# Altium schematic symbol library Schlib.SchLib: 725 symbols (part 5 of 6) (continued)
## SQESC 2670
designator ESC?  (value not drawn)
LUCID_12S 90A ESC; Manufacturer Part Number: SQESC 2670
footprint SQESC 2670
pins: 1 GND, 2 BAT+, 3 U, 4 V, 5 W, 6 S_GND, 7 Tx, 8 PWM

## SQJA81EP-T1_GE3
designator Q?  (value not drawn)
Transistor MOSFET P-CH 80V 46A 8-Pin PowerPAK SO; Manufacturer: Vishay; Manufacturer Part Number: SQJA81EP-T1_GE3; Supplier: Mouser; Supplier Part Number: 78-SQJA81EP-T1_GE3; RoHS: No; Category: MOSFETs; Stock: 6541; Pricing: 1=2.15, 10=1.79, 50=1.79, 100=1.43, 1000=1.05, 10000=0.97 (USD)
footprint SQJA81EP-T1_GE3
pins: 1 S, 2 S, 3 S, 4 G, 5_0 D, 5_1 D, 5_2 D, 5_3 D

## SRV05-4.TCT
designator U?
SRV Series 17.5 V 3 pF SMT RailClamp® Low Capacitance TVS Diode Array SOT-23-6; Manufacturer: Semtech; Manufacturer Part Number: SRV05-4.TCT; Breakdown Voltage: 6V; Value: 5pF; Clamping Voltage: 12.5V; Current: 5A; Direction: Unidirectional; ESD Protection: Yes; Leakage Current: 5µA; Max Power Dissipation: 300W; Number of Bidirectional Channels: 4; Number of Elements: 1; Operating Supply Voltage: 5V; Peak Pulse Current: 12A; Test Current: 1mA; Supplier: Arrow Electronics; Supplier Part Number: SRV05-4.TCT; RoHS: Compliant; Category: TVS Diodes; Stock: 1566000; Pricing: 3000=0.3492 (USD); Case/Package: SOT-23; China RoHS: Compliant; Country of Origin: Mainland China; Depth: 1.6mm; Export Control Classification Number (ECCN) Code: EAR99; Height: 1.15mm; Harmonized Tariff Schedule (HTS) Code: 8541.10.00.50; Introduction Date: 2002-08-22; Lead Free: Lead Free; Length: 2.9mm; Lifecycle Status: Production; Max Breakdown Voltage: 6V; Max Operating Temperature: 125°C; Max Reverse Leakage Current: 5µA; Min Breakdown Voltage: 6V; Min Operating Temperature: -55°C; Mounting Technology: Surface Mount; Number of Channels: 4; Pins: 6; Number of Terminals: 6; Packaging: Cut Tape; Peak Pulse Power: 300W; Polarity: Unidirectional; Power Line Protection: Yes; Power Rating: 300W; Radiation Hardening: No; REACH SVHC: Yes; Reverse Breakdown Voltage: 6V; Reverse Standoff Voltage: 5V; Schedule B: 8542390000, 8542390000|8542390000|8542390000|8542390000|8542390000; Voltage: 5V; Voltage Rating (DC): 5V; Width: 1.6mm; Working Voltage: 5V; ComponentLink1URL: https://datasheet.octopart.com:443/SRV05-4.TCT-Semtech-datasheet-33008608.pdf?src-supplier=IHS; ComponentLink1Description: https://datasheet.octopart.com:443/SRV05-4.TCT-Semtech-datasheet-33008608.pdf?src-supplier=IHS; ComponentLink2URL: https://datasheet.octopart.com:443/SRV05-4.TCT-Semtech-datasheet-604703.pdf?src-supplier=Arrow+Electronics; ComponentLink2Description: https://datasheet.octopart.com:443/SRV05-4.TCT-Semtech-datasheet-604703.pdf?src-supplier=Arrow+Electronics; ComponentLink3URL: https://datasheet.octopart.com:443/SRV05-4.TCT-Semtech-datasheet-41194810.pdf?src-supplier=TME; ComponentLink3Description: https://datasheet.octopart.com:443/SRV05-4.TCT-Semtech-datasheet-41194810.pdf?src-supplier=TME; ComponentLink4URL: https://datasheet.octopart.com:443/SRV05-4.TCT-Semtech-datasheet-10542293.pdf?src-supplier=Farnell; ComponentLink4Description: https://datasheet.octopart.com:443/SRV05-4.TCT-Semtech-datasheet-10542293.pdf?src-supplier=Farnell; ComponentLink5URL: https://datasheet.octopart.com:443/SRV05-4.TCT-Semtech-datasheet-14048601.pdf?src-supplier=iiiC; ComponentLink5Description: https://datasheet.octopart.com:443/SRV05-4.TCT-Semtech-datasheet-14048601.pdf?src-supplier=iiiC
footprint SO6_SOT23-6L
pins: 1, 2, 3, 4, 5, 6

## SS-7188S-A-NF
designator J?  (value not drawn)
Modular Connectors / Ethernet Connectors RJ45 Connector; Manufacturer: Bel; Manufacturer Part Number: SS-7188S-A-NF; Supplier: Rs; Supplier Part Number: 437165; RoHS: Yes; Category: Connectors; Stock: 3103; Pricing: 1=2.19, 15=2.05, 50=1.96 (EUR); Lead Free: 5698LeadFree; ComponentLink1URL: https://datasheet.ciiva.com/11726/0900766b8001c3e8-11726092.pdf?src-supplier=Rs; ComponentLink1Description: https://datasheet.ciiva.com/11726/0900766b8001c3e8-11726092.pdf?src-supplier=Rs; ComponentLink2URL: https://datasheet.ciiva.com/685/ct710001-685643.pdf?src-supplier=Digikey; ComponentLink2Description: https://datasheet.ciiva.com/685/ct710001-685643.pdf?src-supplier=Digikey; ComponentLink3URL: https://datasheet.ciiva.com/26934/getdatasheetpartid-781435-26934401.pdf?src-supplier=Verical; ComponentLink3Description: https://datasheet.ciiva.com/26934/getdatasheetpartid-781435-26934401.pdf?src-supplier=Verical; ComponentLink4URL: https://datasheet.ciiva.com/3138/ct710001-3138744.pdf?src-supplier=Avnet; ComponentLink4Description: https://datasheet.ciiva.com/3138/ct710001-3138744.pdf?src-supplier=Avnet; ComponentLink5URL: https://datasheet.ciiva.com/15170/getdatasheetpartid-79418-15170477.pdf?src-supplier=Verical; ComponentLink5Description: https://datasheet.ciiva.com/15170/getdatasheetpartid-79418-15170477.pdf?src-supplier=Verical
footprint SS-7188S-A-NF
pins: 1 P1, 2 P2, 3 P3, 4 P4, 5 P5, 6 P6, 7 P7, 8 P8, S1 SHIELD, S2 SHIELD

## SSD_PINs
designator J?  (value not drawn)
67 Position Female Connector M.2 (NGFF) Mini Card Gold 0.020 (0.50mm) Black
footprint SSD layout
pins: 1, 2, 3 (power), 4, 5, 6, 7, 8, 9 (power), 10, 11, 12, 13, 14, 15 (power), 16, 17, 18, 19, 20, 21 (power), 22, 23, 24, 25, 26, 27 (power), 28, 29, 30, 31, 32, 33 (power), 34, 35, 36, 37, 38, 39 (power), 40, 41, 42, 43, 44, 45 (power), 46, 47, 48, 49, 50, 51 (power), 52, 53, 54, 55, 56, 57 (power), 58, 67, 68, 69, 70, 71, 72, 73, 74, 75

## STL6P3LLH6
designator Q?  (value not drawn)
P-channel 30 V, 0.024 Ohm typ., 6 A STripFET H6 Power MOSFET in a PowerFLAT 3.3 x 3.3 package; Manufacturer: STMicroelectronics; Manufacturer Part Number: STL6P3LLH6; Supplier: Mouser; Supplier Part Number: 511-STL6P3LLH6; RoHS: Yes; Category: MOSFETs; Stock: 55494; Pricing: 1=1.13, 10=0.925, 50=0.925, 100=0.719, 1000=0.497, 10000=0.434 (USD); ComponentLink1URL: http://www.mouser.com/ds/2/389/stl6p3llh6-956152.pdf?src-supplier=Mouser; ComponentLink1Description: http://www.mouser.com/ds/2/389/stl6p3llh6-956152.pdf?src-supplier=Mouser; ComponentLink2URL: http://www.farnell.com/datasheets/2819085.pdf?src-supplier=Farnell; ComponentLink2Description: http://www.farnell.com/datasheets/2819085.pdf?src-supplier=Farnell; ComponentLink3URL: http://www.st.com/st-web-ui/static/active/en/resource/technical/document/datasheet/DM00064617.pdf?src-supplier=Avnet; ComponentLink3Description: http://www.st.com/st-web-ui/static/active/en/resource/technical/document/datasheet/DM00064617.pdf?src-supplier=Avnet; ComponentLink4URL: https://datasheet.octopart.com/STL6P3LLH6-STMicroelectronics-datasheet-16349406.pdf?src-supplier=Future+Electronics; ComponentLink4Description: https://datasheet.octopart.com/STL6P3LLH6-STMicroelectronics-datasheet-16349406.pdf?src-supplier=Future+Electronics; ComponentLink5URL: http://www.st.com/content/ccc/resource/technical/document/datasheet/3c/90/16/29/a8/76/48/02/DM00064617.pdf/files/DM00064617.pdf/jcr:content/translations/en.DM00064617.pdf?src-supplier=Digikey; ComponentLink5Description: http://www.st.com/content/ccc/resource/technical/document/datasheet/3c/90/16/29/a8/76/48/02/DM00064617.pdf/files/DM00064617.pdf/jcr:content/translations/en.DM00064617.pdf?src-supplier=Digikey
footprint STL6P3LLH6
pins: 1 S, 2 S, 3 S, 4 G, 5 D5

## STM32F103C8T6
designator U?  (value not drawn)
ARM Cortex-M3 STM32 F1 Microcontroller 32-Bit 72MHz 64kB FLASH LQFP48 STM32F103C8T6; Manufacturer: STMicroelectronics; RAM Size: 20KB; Interface: I2C,SPI,USB,CAN,USART; Number of I/Os: 37; Number of Timers/Counters: 3; Max Supply Voltage: 3.6V; Number of ADC Channels: 10; Min Supply Voltage: 2V; Data Bus Width: 32b; Nominal Supply Current: 1.7uA; Number of A/D Converters: 2; Supplier: Mouser; Supplier Part Number: 511-STM32F103C8T6; Manufacturer Part Number: STM32F103C8T6; RoHS: Yes; Category: Microcontrollers; Stock: 24695; Pricing: 1=6.11, 10=5.53, 50=5.27, 100=4.58, 1000=3.47, 10000=3.33 (USD); Case/Package: LQFP; Pins: 48; Weight: 0.006349oz; Min Operating Temperature: -40°C; Max Operating Temperature: 85°C; Packaging: Tray; Package Quantity: 1500; Memory Format: FLASH; Clock Frequency: 72MHz; Memory Size: 64KB; Core Architecture: ARM; Series: STM32F103C8; Number of Channels: 10; Length: 7mm; Width: 7mm; Height: 1.4mm; Lead Free: Lead Free; RoHS Compliant: Yes
footprint STM32F103C8T6
pins: 1 VBAT, 2 PC13-TAMPER-RTC, 3 PC14-OSC32_IN, 4 PC15-OSC32_OUT, 5 PD0_OSC_IN, 6 PD1_OSC_OUT, 7 NRST, 8 VSSA, 9 VDDA, 10 PA0_WKUP, 11 PA1, 12 PA2, 13 PA3, 14 PA4, 15 PA5, 16 PA6, 17 PA7, 18 PB0, 19 PB1, 20 PB2/BOOT1, 21 PB10/I2C2_SCL, 22 PB11/I2C2_SDA, 23 VSS, 24 VDD, 25 PB12, 26 PB13, 27 PB14, 28 PB15, 29 PA8, 30 PA9, 31 PA10, 32 PA11, 33 PA12, 34 PA13/SWDIO, 35 VSS, 36 VDD, 37 PA14/SWCLK, 38 PA15, 39 PB3, 40 PB4, 41 PB5, 42 PB6/I2C1_SCL, 43 PB7/I2C1_SDA, 44 BOOT0, 45 PB8, 46 PB9, 47 VSS, 48 VDD

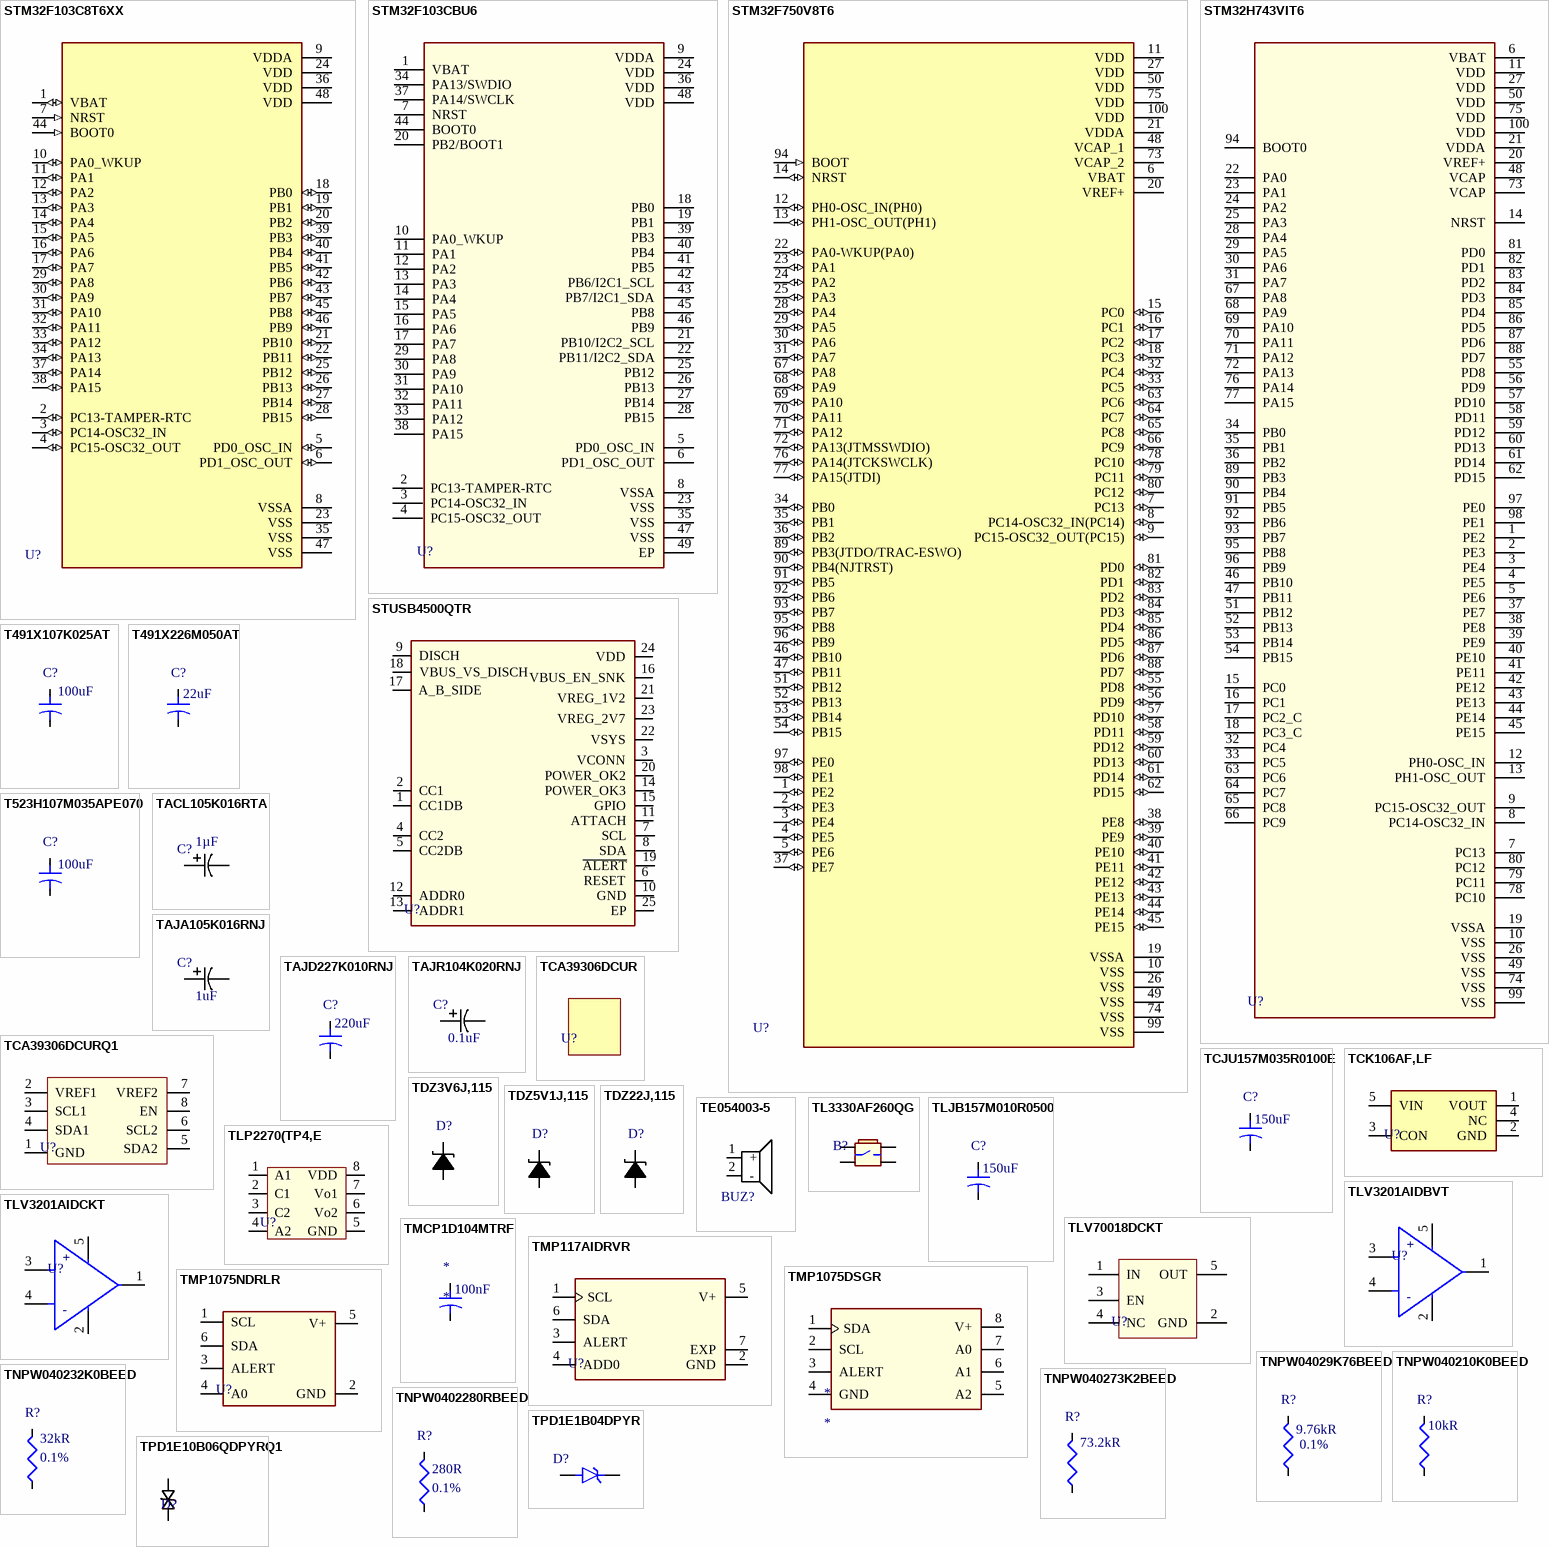
[diagram p19: symbols STM32F103C8T6XX to TPD1E10B06QDPYRQ1]

## STM32F103C8T6XX
designator U?
Ultra-low-power ARM Cortex-M3 MCU with 256 Kbytes Flash, 32 MHz CPU, USB, 2xOp-amp; Manufacturer Part Number: STM32F103C8T6; Manufacturer: STMicroelectronics; ADC Channels (Resolution): 14-Ch 12-Bit; DAC Channels (Resolution): 2-Ch 12-Bit (2); Data Bus Width: 32b; EEPROM Memory Size: 8kB; Flash Memory Size: 256kB; Frequency: 32MHz; Interface: IrDA, LIN, USB; Clock Frequency: 24MHz; Max Power Dissipation: 625mW; Max Supply Current: 12.3mA; Max Supply Voltage: 3.6V; Min Supply Voltage: 1.8V; Nominal Supply Current: 300nA; Number of Channels: 14; Number of D/A Converters: 2; Number of I/Os: 37; Number of SPI Channels: 3; Number of Timers/Counters: 1; Operating Supply Voltage: 3V; Oscillator Type: Internal; Peripherals: POR; RAM Size: 32kB; Watchdog Timer: Yes; Supplier: Arrow Electronics; Supplier Part Number: STM32L151CCU6TR; RoHS: Compliant; Category: Microcontrollers; Stock: 5000; Pricing: 2500=3.655 (USD); Case/Package: UFQFPN; China RoHS: Compliant; Core Architecture: ARM; Country of Origin: Mainland China; Export Control Classification Number (ECCN) Code: 3A991.A.2; Height - Seated (Max): 650µm; Harmonized Tariff Schedule (HTS) Code: 8542.31.00.25; Introduction Date: 2013-02-01; Length: 7mm; Lifecycle Status: Production; Max Operating Temperature: 85°C; Memory Size: 256kB; Memory Format: FLASH; Min Operating Temperature: -40°C; Number of I2C Channels: 2; Number of Programmable I/O: 37; Number of Terminals: 48; Number of USART Channels: 3; Packaging: Tape and Reel; REACH SVHC: Yes; Schedule B: 8542310000; Temperature Grade: Industrial; Terminal Pitch: 500µm; Width: 7mm; ComponentLink1URL: https://datasheet.octopart.com:443/STM32L151CCU6TR-STMicroelectronics-datasheet-104429913.pdf?src-supplier=IHS; ComponentLink1Description: https://datasheet.octopart.com:443/STM32L151CCU6TR-STMicroelectronics-datasheet-104429913.pdf?src-supplier=IHS; ComponentLink2URL: https://datasheet.octopart.com:443/STM32L151CCU6TR-STMicroelectronics-datasheet-13725669.pdf?src-supplier=Upverter; ComponentLink2Description: https://datasheet.octopart.com:443/STM32L151CCU6TR-STMicroelectronics-datasheet-13725669.pdf?src-supplier=Upverter; ComponentLink3URL: https://datasheet.octopart.com:443/STM32L151CCU6TR-STMicroelectronics-datasheet-62336827.pdf?src-supplier=Future+Electronics; ComponentLink3Description: https://datasheet.octopart.com:443/STM32L151CCU6TR-STMicroelectronics-datasheet-62336827.pdf?src-supplier=Future+Electronics; ComponentLink4URL: https://datasheet.octopart.com:443/STM32L151CCU6TR-STMicroelectronics-datasheet-159009206.pdf?src-supplier=SHENGYU+ELECTRONICS; ComponentLink4Description: https://datasheet.octopart.com:443/STM32L151CCU6TR-STMicroelectronics-datasheet-159009206.pdf?src-supplier=SHENGYU+ELECTRONICS
footprint LQFP-48
pins: 1 VBAT (io), 2 PC13-TAMPER-RTC (io), 3 PC14-OSC32_IN (io), 4 PC15-OSC32_OUT (io), 5 PD0_OSC_IN (io), 6 PD1_OSC_OUT (io), 7 NRST (in), 8 VSSA (power), 9 VDDA (power), 10 PA0_WKUP (io), 11 PA1 (io), 12 PA2 (io), 13 PA3 (io), 14 PA4 (io), 15 PA5 (io), 16 PA6 (io), 17 PA7 (io), 18 PB0 (io), 19 PB1 (io), 20 PB2 (io), 21 PB10 (io), 22 PB11 (io), 23 VSS (power), 24 VDD (power), 25 PB12 (io), 26 PB13 (io), 27 PB14 (io), 28 PB15 (io), 29 PA8 (io), 30 PA9 (io), 31 PA10 (io), 32 PA11 (io), 33 PA12 (io), 34 PA13 (io), 35 VSS (power), 36 VDD (power), 37 PA14 (io), 38 PA15 (io), 39 PB3 (io), 40 PB4 (io), 41 PB5 (io), 42 PB6 (io), 43 PB7 (io), 44 BOOT0 (in), 45 PB8 (io), 46 PB9 (io), 47 VSS (power), 48 VDD (power)

## STM32F103CBU6
designator U?  (value not drawn)
MCU 32-bit STM32F1 ARM Cortex M3 RISC 128KB Flash 2.5V/3.3V 48-Pin UFQFPN EP Tray; Manufacturer: STMicroelectronics; Manufacturer Part Number: STM32F103CBU6; Interface: I2C,SPI,USB,CAN,USART,IrDA,UART,LIN; Number of I/Os: 37; Oscillator Type: Internal; Peripherals: POR,PWM,WDT,DMA,Temp Sensor; Frequency: 72MHz; RAM Size: 20KB; Max Supply Voltage: 3.6V; Number of Timers/Counters: 4; Number of PWM Channels: 1; Min Supply Voltage: 2V; Data Bus Width: 32b; Number of ADC Channels: 10; Number of SPI Channels: 2; Watchdog Timer: Yes; Supplier: Mouser; Supplier Part Number: 511-STM32F103CBU6; RoHS: Yes; Category: Microcontrollers; Stock: 369; Pricing: 1=6.83, 10=6.17, 50=5.88, 100=5.11, 1000=3.87, 10000=3.87 (USD); Case/Package: UFQFPN; Pins: 48; Min Operating Temperature: -40°C; Max Operating Temperature: 85°C; Packaging: Tray; Memory Format: FLASH; Memory Size: 128KB; Core Architecture: ARM; Series: STM32 F1; Package Quantity: 260; Number of Programmable I/O: 37; Clock Frequency: 72MHz; Number of USB Channels: 1; Number of I2C Channels: 2; Length: 7.1mm; Width: 7.1mm; Height: 0.5mm; Radiation Hardening: No; RoHS Compliant: Yes; Reach SVHC Compliant: No; ComponentLink1URL: https://datasheet.ciiva.com/8054/1730126-8054952.pdf?src-supplier=Element14; ComponentLink1Description: https://datasheet.ciiva.com/8054/1730126-8054952.pdf?src-supplier=Element14; ComponentLink2URL: https://datasheet.ciiva.com/12271/cd00161566-12271965.pdf?src-supplier=Mouser; ComponentLink2Description: https://datasheet.ciiva.com/12271/cd00161566-12271965.pdf?src-supplier=Mouser
footprint STM32F103CBU6
pins: 1 VBAT, 2 PC13-TAMPER-RTC, 3 PC14-OSC32_IN, 4 PC15-OSC32_OUT, 5 PD0_OSC_IN, 6 PD1_OSC_OUT, 7 NRST, 8 VSSA, 9 VDDA, 10 PA0_WKUP, 11 PA1, 12 PA2, 13 PA3, 14 PA4, 15 PA5, 16 PA6, 17 PA7, 18 PB0, 19 PB1, 20 PB2/BOOT1, 21 PB10/I2C2_SCL, 22 PB11/I2C2_SDA, 23 VSS, 24 VDD, 25 PB12, 26 PB13, 27 PB14, 28 PB15, 29 PA8, 30 PA9, 31 PA10, 32 PA11, 33 PA12, 34 PA13/SWDIO, 35 VSS, 36 VDD, 37 PA14/SWCLK, 38 PA15, 39 PB3, 40 PB4, 41 PB5, 42 PB6/I2C1_SCL, 43 PB7/I2C1_SDA, 44 BOOT0, 45 PB8, 46 PB9, 47 VSS, 48 VDD, 49 EP

## STM32F750V8T6
designator U?
ARMÂ® CortexÂ®-M7 STM32F7 Microcontroller IC 32-Bit Single-Core 216MHz 64KB (64K x 8) FLASH 100-LQFP (14x14); Manufacturer Part Number: STM32F750V8T6
footprint QFP50P1600X1600X160-100N
pins: 1 PE2 (io), 2 PE3 (io), 3 PE4 (io), 4 PE5 (io), 5 PE6 (io), 6 VBAT (power), 7 PC13 (io), 8 PC14-OSC32_IN(PC14) (io), 9 PC15-OSC32_OUT(PC15) (io), 10 VSS (power), 11 VDD (power), 12 PH0-OSC_IN(PH0) (io), 13 PH1-OSC_OUT(PH1) (io), 14 NRST (io), 15 PC0 (io), 16 PC1 (io), 17 PC2 (io), 18 PC3 (io), 19 VSSA (power), 20 VREF+ (power), 21 VDDA (power), 22 PA0-WKUP(PA0) (io), 23 PA1 (io), 24 PA2 (io), 25 PA3 (io), 26 VSS (power), 27 VDD (power), 28 PA4 (io), 29 PA5 (io), 30 PA6 (io), 31 PA7 (io), 32 PC4 (io), 33 PC5 (io), 34 PB0 (io), 35 PB1 (io), 36 PB2 (io), 37 PE7 (io), 38 PE8 (io), 39 PE9 (io), 40 PE10 (io), 41 PE11 (io), 42 PE12 (io), 43 PE13 (io), 44 PE14 (io), 45 PE15 (io), 46 PB10 (io), 47 PB11 (io), 48 VCAP_1 (power), 49 VSS (power), 50 VDD (power), 51 PB12 (io), 52 PB13 (io), 53 PB14 (io), 54 PB15 (io), 55 PD8 (io), 56 PD9 (io), 57 PD10 (io), 58 PD11 (io), 59 PD12 (io), 60 PD13 (io), 61 PD14 (io), 62 PD15 (io), 63 PC6 (io), 64 PC7 (io), 65 PC8 (io), 66 PC9 (io), 67 PA8 (io), 68 PA9 (io), 69 PA10 (io), 70 PA11 (io), 71 PA12 (io), 72 PA13(JTMSSWDIO) (io), 73 VCAP_2 (power), 74 VSS (power), 75 VDD (power), 76 PA14(JTCKSWCLK) (io), 77 PA15(JTDI) (io), 78 PC10 (io), 79 PC11 (io), 80 PC12 (io), 81 PD0 (io), 82 PD1 (io), 83 PD2 (io), 84 PD3 (io), 85 PD4 (io), 86 PD5 (io), 87 PD6 (io), 88 PD7 (io), 89 PB3(JTDO/TRAC-ESWO) (io), 90 PB4(NJTRST) (io), 91 PB5 (io), 92 PB6 (io), 93 PB7 (io), 94 BOOT (in), 95 PB8 (io), 96 PB9 (io), 97 PE0 (io), 98 PE1 (io), 99 VSS (power), 100 VDD (power)

## STM32H743VIT6
designator U?  (value not drawn)
MCU 32-Bit STM32 ARM Cortex M7 RISC 2MB Flash 1.8V/2.5V/3.3V 100-Pin LQFP Tray; Manufacturer: STMicroelectronics; Manufacturer Part Number: STM32H743VIT6; Interface: I2C,SPI,USB,Ethernet,IrDA,MMC,SDIO,SD,UART,USART,EBI/EMI; Peripherals: Brown-out Detect/Reset,POR,PWM,WDT,DMA,LCD; Number of I/Os: 82; Oscillator Type: Internal; Supplier: Mouser; Supplier Part Number: 511-STM32H743VIT6; RoHS: Yes; Category: Microcontrollers; Stock: 20864; Pricing: 1=15.83, 10=14.55, 50=12.29, 100=12.29, 1000=10.02, 10000=10.02 (USD); Mounting Technology: Surface Mount; Case/Package: LQFP; Min Operating Temperature: -40°C; Max Operating Temperature: 85°C; Memory Format: FLASH; Packaging: Tray; Core Architecture: ARM; Memory Size: 2MB; Series: STM32H7; RoHS Compliant: Yes; ComponentLink1URL: http://www.farnell.com/datasheets/2551152.pdf?src-supplier=Farnell; ComponentLink1Description: http://www.farnell.com/datasheets/2551152.pdf?src-supplier=Farnell; ComponentLink2URL: http://www.farnell.com/datasheets/2551152.pdf?src-supplier=Element14; ComponentLink2Description: http://www.farnell.com/datasheets/2551152.pdf?src-supplier=Element14; ComponentLink3URL: http://www.farnell.com/datasheets/2551152.pdf?src-supplier=Newark; ComponentLink3Description: http://www.farnell.com/datasheets/2551152.pdf?src-supplier=Newark; ComponentLink4URL: http://www.st.com/content/ccc/resource/technical/document/reference_manual/group0/c9/a3/76/fa/55/46/45/fa/DM00314099/files/DM00314099.pdf/jcr:content/translations/en.DM00314099.pdf?src-supplier=Digikey; ComponentLink4Description: http://www.st.com/content/ccc/resource/technical/document/reference_manual/group0/c9/a3/76/fa/55/46/45/fa/DM00314099/files/DM00314099.pdf/jcr:content/translations/en.DM00314099.pdf?src-supplier=Digikey
footprint STM32H743VIT6
pins: 1 PE2, 2 PE3, 3 PE4, 4 PE5, 5 PE6, 6 VBAT, 7 PC13, 8 PC14-OSC32_IN, 9 PC15-OSC32_OUT, 10 VSS, 11 VDD, 12 PH0-OSC_IN, 13 PH1-OSC_OUT, 14 NRST, 15 PC0, 16 PC1, 17 PC2_C, 18 PC3_C, 19 VSSA, 20 VREF+, 21 VDDA, 22 PA0, 23 PA1, 24 PA2, 25 PA3, 26 VSS, 27 VDD, 28 PA4, 29 PA5, 30 PA6, 31 PA7, 32 PC4, 33 PC5, 34 PB0, 35 PB1, 36 PB2, 37 PE7, 38 PE8, 39 PE9, 40 PE10, 41 PE11, 42 PE12, 43 PE13, 44 PE14, 45 PE15, 46 PB10, 47 PB11, 48 VCAP, 49 VSS, 50 VDD, 51 PB12, 52 PB13, 53 PB14, 54 PB15, 55 PD8, 56 PD9, 57 PD10, 58 PD11, 59 PD12, 60 PD13, 61 PD14, 62 PD15, 63 PC6, 64 PC7, 65 PC8, 66 PC9, 67 PA8, 68 PA9, 69 PA10, 70 PA11, 71 PA12, 72 PA13, 73 VCAP, 74 VSS, 75 VDD, 76 PA14, 77 PA15, 78 PC10, 79 PC11, 80 PC12, 81 PD0, 82 PD1, 83 PD2, 84 PD3, 85 PD4, 86 PD5, 87 PD6, 88 PD7, 89 PB3, 90 PB4, 91 PB5, 92 PB6, 93 PB7, 94 BOOT0, 95 PB8, 96 PB9, 97 PE0, 98 PE1, 99 VSS, 100 VDD

## STUSB4500QTR
designator U?  (value not drawn)
4.1V~22V USB 2.0 I2C Controllers Interface ICs STUSB45 Controller 24-VFQFN Exposed Pad; Manufacturer: STMicroelectronics; Manufacturer Part Number: STUSB4500QTR; USB Standard: 6108USBStandard; Max Supply Voltage: 22V; Min Supply Voltage: 3V; Supplier: Mouser; Supplier Part Number: 511-STUSB4500QTR; RoHS: Yes; Category: USB Interface ICs; Stock: 30202; Pricing: 1=2.71, 10=2.44, 50=2.31, 100=2, 1000=1.44, 10000=1.36 (USD); Height: 1mm; ComponentLink1URL: http://www.farnell.com/datasheets/2710898.pdf?src-supplier=Farnell; ComponentLink1Description: http://www.farnell.com/datasheets/2710898.pdf?src-supplier=Farnell; ComponentLink2URL: http://www.farnell.com/datasheets/2710898.pdf?src-supplier=Element14; ComponentLink2Description: http://www.farnell.com/datasheets/2710898.pdf?src-supplier=Element14; ComponentLink3URL: http://www.farnell.com/datasheets/2710898.pdf?src-supplier=Newark; ComponentLink3Description: http://www.farnell.com/datasheets/2710898.pdf?src-supplier=Newark; ComponentLink4URL: http://www.st.com/content/ccc/resource/technical/document/datasheet/group3/1c/4a/55/d7/17/01/44/86/DM00489312/files/DM00489312.pdf/jcr:content/translations/en.DM00489312.pdf?src-supplier=Digikey; ComponentLink4Description: http://www.st.com/content/ccc/resource/technical/document/datasheet/group3/1c/4a/55/d7/17/01/44/86/DM00489312/files/DM00489312.pdf/jcr:content/translations/en.DM00489312.pdf?src-supplier=Digikey; ComponentLink5URL: https://datasheet.octopart.com/STUSB4500QTR-STMicroelectronics-datasheet-101746762.pdf?src-supplier=SHENGYU+ELECTRONICS; ComponentLink5Description: https://datasheet.octopart.com/STUSB4500QTR-STMicroelectronics-datasheet-101746762.pdf?src-supplier=SHENGYU+ELECTRONICS
pins: 1 CC1DB, 2 CC1, 3 VCONN, 4 CC2, 5 CC2DB, 6 RESET, 7 SCL, 8 SDA, 9 DISCH, 10 GND, 11 ATTACH, 12 ADDR0, 13 ADDR1, 14 POWER_OK3, 15 GPIO, 16 VBUS_EN_SNK, 17 A_B_SIDE, 18 VBUS_VS_DISCH, 19 ~{ALERT}, 20 POWER_OK2, 21 VREG_1V2, 22 VSYS, 23 VREG_2V7, 24 VDD, 25 EP

## T491X107K025AT
designator C?  value 100uF  (hidden comment: *)
Cap Tant Solid 100uF 25V X CASE 10% (7.3 X 4.3 X 4mm) Inward L SMD 7343-43 0.3 Ohm 125C T/R; Manufacturer: KEMET; Manufacturer Part Number: T491X107K025AT; Supplier: Mouser; Supplier Part Number: 80-T491X107K025AT; RoHS: No; Category: Tantalum Capacitors; Stock: 40606; Pricing: 1=2.57, 10=2.03, 50=2.03, 100=1.69, 1000=1.19, 10000=1.11 (USD); ComponentLink1URL: https://datasheet.ciiva.com/28571/1854511-28571717.pdf?src-supplier=Element14; ComponentLink1Description: https://datasheet.ciiva.com/28571/1854511-28571717.pdf?src-supplier=Element14; ComponentLink2URL: https://datasheet.ciiva.com/6229/kem-t2005-t491-6229625.pdf?src-supplier=Digikey; ComponentLink2Description: https://datasheet.ciiva.com/6229/kem-t2005-t491-6229625.pdf?src-supplier=Digikey; ComponentLink3URL: https://datasheet.ciiva.com/6229/kem-t2005-t491-6229626.pdf?src-supplier=Digikey; ComponentLink3Description: https://datasheet.ciiva.com/6229/kem-t2005-t491-6229626.pdf?src-supplier=Digikey; ComponentLink4URL: https://datasheet.ciiva.com/6229/kem-t2005-t491-6229627.pdf?src-supplier=Digikey; ComponentLink4Description: https://datasheet.ciiva.com/6229/kem-t2005-t491-6229627.pdf?src-supplier=Digikey; ComponentLink5URL: https://datasheet.ciiva.com/22716/1854511-22716393.pdf?src-supplier=Element14; ComponentLink5Description: https://datasheet.ciiva.com/22716/1854511-22716393.pdf?src-supplier=Element14; ComponentLink6URL: https://datasheet.ciiva.com/22716/1854511-22716394.pdf?src-supplier=Element14; ComponentLink6Description: https://datasheet.ciiva.com/22716/1854511-22716394.pdf?src-supplier=Element14; Case/Package: 2917
footprint Tantal 2917  Height 4.30mm
pins: 1 P, 2 N

## T491X226M050AT
designator C?  value 22uF  (hidden comment: *)
Cap Tant Solid 22uF 50V X CASE 20% (7.3 X 4.3 X 4mm) SMD 7343-43 0.6 Ohm 125 C T/R; Manufacturer: KEMET; Manufacturer Part Number: T491X226M050AT; Supplier: Farnell; Supplier Part Number: 2535289; RoHS: Yes; Category: Tantalum Capacitors; Stock: 500; Pricing: 1=5.36, 10=4.05, 50=3.46, 100=3.28 (EUR); ComponentLink1URL: https://datasheet.ciiva.com/22691/1778339-22691440.pdf?src-supplier=Element14; ComponentLink1Description: https://datasheet.ciiva.com/22691/1778339-22691440.pdf?src-supplier=Element14; ComponentLink2URL: https://datasheet.ciiva.com/6247/datasheetpn-t491x226m050at-6247266.pdf?src-supplier=Digikey; ComponentLink2Description: https://datasheet.ciiva.com/6247/datasheetpn-t491x226m050at-6247266.pdf?src-supplier=Digikey; ComponentLink3URL: https://datasheet.ciiva.com/12882/kem-t2005-t491-12882698.pdf?src-supplier=Mouser; ComponentLink3Description: https://datasheet.ciiva.com/12882/kem-t2005-t491-12882698.pdf?src-supplier=Mouser; ComponentLink4URL: https://datasheet.ciiva.com/6247/kem-t2005-t491-6247262.pdf?src-supplier=Digikey; ComponentLink4Description: https://datasheet.ciiva.com/6247/kem-t2005-t491-6247262.pdf?src-supplier=Digikey
footprint Tantal 2917  Height 4.30mm
pins: 1 P, 2 N

## T523H107M035APE070
designator C?  value 100uF  (hidden comment: *)
Cap Tant Polymer 100uF 35VDC H CASE 20% (7.3 X 6 X 1.9mm) SMD 7360-20 0.07 Ohm 85°C T/R; Manufacturer: KEMET; Manufacturer Part Number: T523H107M035APE070; Supplier: Mouser; Supplier Part Number: 80-T523H107M35APE070; RoHS: Yes; Category: Polymer Capacitors; Stock: 2913; Pricing: 1=4.62, 10=3.98, 50=3.61, 100=2.98, 1000=2.4, 10000=2.35 (USD); ComponentLink1URL: https://media.digikey.com/pdf/Data%20Sheets/Kemet%20PDFs/T523H107M035APE070_Spec_Prelim.pdf?src-supplier=Digikey; ComponentLink1Description: https://media.digikey.com/pdf/Data%20Sheets/Kemet%20PDFs/T523H107M035APE070_Spec_Prelim.pdf?src-supplier=Digikey; ComponentLink2URL: https://datasheet.octopart.com/T523H107M035APE070-KEMET-datasheet-158238326.pdf?src-supplier=TME; ComponentLink2Description: https://datasheet.octopart.com/T523H107M035APE070-KEMET-datasheet-158238326.pdf?src-supplier=TME
footprint T523H107M035APE070 (Molded Capacitor, 2-Leads, Body 7.30x6.10mm, IPC Medium Density)
pins: 1 P, 2 N

## TACL105K016RTA
designator C?  value 1µF  (hidden comment: *)
Cap Tant Solid 1uF 16V L CASE 10% (1.6 X 0.85 X 0.85mm) SMD 1608-10 7.5 Ohm 125C Plastic T/R; Manufacturer: KYOCERA AVX; Manufacturer Part Number: TACL105K016RTA; Dielectric Material: Tantalum; Dissipation Factor: 6%; ESR (Equivalent Series Resistance): 7.5Ω; Leakage Current: 500nA; Polarity: Polar; Ripple Current: 23mA; Supplier: DigiKey; Supplier Part Number: 478-12994-1-ND; RoHS: Compliant; Category: Tantalum Capacitors; Stock: 527; Pricing: 1=2.43, 10=1.667, 50=1.3632, 100=1.2692, 500=1.1102, 1000=1.0684 (USD); Case/Package: 0603; Case Code (Imperial): 0603; Case Code (Metric): 1608; China RoHS: Compliant; Depth: 850µm; Height: 850µm; Length: 1.6mm; Lifecycle Status: Production; Max Operating Temperature: 125°C; Min Operating Temperature: -55°C; Mounting Technology: Surface Mount; Pins: 2; Number of Terminals: 2; Radiation Hardening: No; REACH SVHC: Yes; Schedule B: 8532210050; Termination: SMD/SMT; Tolerance: 10%; Voltage Rating: 16V; Voltage Rating (DC): 16V; Weight: 2.012816mg; Width: 850µm; ComponentLink1URL: https://datasheet.octopart.com:443/TACL105K016RTA-KYOCERA-AVX-datasheet-158983642.pdf?src-supplier=Newark; ComponentLink1Description: https://datasheet.octopart.com:443/TACL105K016RTA-KYOCERA-AVX-datasheet-158983642.pdf?src-supplier=Newark; ComponentLink2URL: https://datasheet.octopart.com:443/TACL105K016RTA-KYOCERA-AVX-datasheet-21192561.pdf?src-supplier=Newark; ComponentLink2Description: https://datasheet.octopart.com:443/TACL105K016RTA-KYOCERA-AVX-datasheet-21192561.pdf?src-supplier=Newark; ComponentLink3URL: https://datasheet.octopart.com:443/TACL105K016RTA-KYOCERA-AVX-datasheet-182064648.pdf?src-supplier=IHS; ComponentLink3Description: https://datasheet.octopart.com:443/TACL105K016RTA-KYOCERA-AVX-datasheet-182064648.pdf?src-supplier=IHS; ComponentLink4URL: https://datasheet.octopart.com:443/TACL105K016RTA-KYOCERA-AVX-datasheet-50868554.pdf?src-supplier=Future+Electronics; ComponentLink4Description: https://datasheet.octopart.com:443/TACL105K016RTA-KYOCERA-AVX-datasheet-50868554.pdf?src-supplier=Future+Electronics; ComponentLink5URL: http://sigma.octopart.com:80/reach_statement/AVX-company-19.pdf?src-supplier=Compliance+Statements; ComponentLink5Description: http://sigma.octopart.com:80/reach_statement/AVX-company-19.pdf?src-supplier=Compliance+Statements; ComponentLink6URL: http://sigma.octopart.com:80/conflict_mineral_statement/AVX-company-34.pdf?src-supplier=Compliance+Statements; ComponentLink6Description: http://sigma.octopart.com:80/conflict_mineral_statement/AVX-company-34.pdf?src-supplier=Compliance+Statements
footprint C Tan 0603
pins: 1, 2

## TAJA105K016RNJ
designator C?  value 1uF
Cap Tant Solid 1uF 16V A CASE 10%( 3.2 X 1.6 X 1.6mm) Inward L SMD 3216-18 11 Ohm 125C T/R; Part Number: TAJA105K016RNJ; Manufacturer: Kyocera AVX; Dielectric Material: Tantalum; Tolerance: 20%; ESR (Equivalent Series Resistance): 11R; Leakage Current: 500nA; Dissipation Factor: 4%; Life (Hours): 2000Hour; Ripple Current: 83mA; Supplier: Future Electronics; Supplier Part Number: 4679627; Manufacturer Part Number: TAJA105K016RNJ; RoHS: Yes; Category: Tantalum Capacitors; Stock: 130000; Pricing: 2000=0.0674, 4000=0.0662, 6000=0.0655, 8000=0.065, 10000=0.0634 (USD); Mounting Technology: Surface Mount,PCB; Case/Package: 1206; Pins: 2; Case Code (Metric): 3216; Case Code (Imperial): 1206; Weight: 0.000571oz; Min Operating Temperature: -55°C; Max Operating Temperature: 125°C; Voltage Rating (DC): 16V; Series: TAJ; Voltage Rating: 16V; Packaging: Tape and Reel; Features: General Purpose; Termination: SMD/SMT; Voltage: 16V; Voltage Rating (AC): 16V; Length: 3.2mm; Width: 1.6mm; Height: 1.6mm; Depth: 1.6mm; Lead Pitch: 1.1mm; Reach SVHC Compliant: No; Lead Free: Lead Free; RoHS Compliant: Yes; ComponentLink1URL: https://datasheet.ciiva.com/263/taj-263409.pdf?src-supplier=Digikey; ComponentLink1Description: https://datasheet.ciiva.com/263/taj-263409.pdf?src-supplier=Digikey; ComponentLink2URL: https://datasheet.ciiva.com/263/taj-263410.pdf?src-supplier=Digikey; ComponentLink2Description: https://datasheet.ciiva.com/263/taj-263410.pdf?src-supplier=Digikey; ComponentLink3URL: https://datasheet.ciiva.com/263/taj-263411.pdf?src-supplier=Digikey; ComponentLink3Description: https://datasheet.ciiva.com/263/taj-263411.pdf?src-supplier=Digikey; ComponentLink4URL: https://datasheet.ciiva.com/18710/taj-eng-18710647.pdf?src-supplier=Distrelec; ComponentLink4Description: https://datasheet.ciiva.com/18710/taj-eng-18710647.pdf?src-supplier=Distrelec; ComponentLink5URL: https://datasheet.ciiva.com/7832/1703059-7832429.pdf?src-supplier=Element14; ComponentLink5Description: https://datasheet.ciiva.com/7832/1703059-7832429.pdf?src-supplier=Element14; ComponentLink6URL: https://datasheet.ciiva.com/7832/1703059-7832430.pdf?src-supplier=Element14; ComponentLink6Description: https://datasheet.ciiva.com/7832/1703059-7832430.pdf?src-supplier=Element14; ComponentLink7URL: https://datasheet.ciiva.com/7832/1680476-7832431.pdf?src-supplier=Element14; ComponentLink7Description: https://datasheet.ciiva.com/7832/1680476-7832431.pdf?src-supplier=Element14; ComponentLink8URL: https://datasheet.ciiva.com/7832/taj-7832810.pdf?src-supplier=Element14; ComponentLink8Description: https://datasheet.ciiva.com/7832/taj-7832810.pdf?src-supplier=Element14; ComponentLink9URL: https://datasheet.ciiva.com/7832/taj-7832811.pdf?src-supplier=Element14; ComponentLink9Description: https://datasheet.ciiva.com/7832/taj-7832811.pdf?src-supplier=Element14
footprint TAJA105K016RNJ
pins: 1, 2

## TAJD227K010RNJ
designator C?  value 220uF  (hidden comment: *)
Cap Tant Solid 220uF 10V D CASE 10% (7.3 X 4.3 X 2.9mm) SMD 7343-31 0.5 Ohm 125C T/R; Manufacturer: Kyocera AVX; Manufacturer Part Number: TAJD227K010RNJ; Dielectric Material: Tantalum; ESR (Equivalent Series Resistance): 500mR; Leakage Current: 22uA; Dissipation Factor: 8%; Polarity: Polar; Supplier: Rs; Supplier Part Number: 1349925; RoHS: Yes; Category: Tantalum Capacitors; Stock: 600; Pricing: 500=0.56000, 2500=0.48600, 5000=0.47400 (GBP); Mounting Technology: Surface Mount,PCB; Case/Package: 2917; Pins: 2; Case Code (Imperial): 2917; Case Code (Metric): 7343; Min Operating Temperature: -55°C; Max Operating Temperature: 125°C; Packaging: Tape and Reel; Tolerance: 10%; Voltage Rating: 10V; Voltage Rating (DC): 10V; Package Quantity: 500; Termination: SMD/SMT; Series: TAJ; Construction: Flat; Voltage: 10V; Features: General Purpose; Length: 7.3mm; Width: 4.3mm; Height: 2.9mm; Depth: 4.3mm; Height - Seated (Max): 0.122inch; Radiation Hardening: No; Lead Free: Lead Free; RoHS Compliant: Yes; Reach SVHC Compliant: Yes; ComponentLink1URL: https://datasheet.ciiva.com/11793/0900766b80ccdc61-11793083.pdf?src-supplier=Rs; ComponentLink1Description: https://datasheet.ciiva.com/11793/0900766b80ccdc61-11793083.pdf?src-supplier=Rs; ComponentLink2URL: https://datasheet.ciiva.com/26341/559469-da-01-en-tacc-d-7-3-mm-x-4-3-mm-x-2-9-mm-220-uf-26341804.pdf?src-supplier=Conrad; ComponentLink2Description: https://datasheet.ciiva.com/26341/559469-da-01-en-tacc-d-7-3-mm-x-4-3-mm-x-2-9-mm-220-uf-26341804.pdf?src-supplier=Conrad; ComponentLink3URL: https://datasheet.ciiva.com/264/taj-264392.pdf?src-supplier=Digi-Key; ComponentLink3Description: https://datasheet.ciiva.com/264/taj-264392.pdf?src-supplier=Digi-Key; ComponentLink4URL: https://datasheet.ciiva.com/264/taj-264391.pdf?src-supplier=Digi-Key; ComponentLink4Description: https://datasheet.ciiva.com/264/taj-264391.pdf?src-supplier=Digi-Key; ComponentLink5URL: https://datasheet.ciiva.com/264/taj-264393.pdf?src-supplier=Digi-Key; ComponentLink5Description: https://datasheet.ciiva.com/264/taj-264393.pdf?src-supplier=Digi-Key; ComponentLink6URL: https://datasheet.ciiva.com/14592/70001050-14592330.pdf?src-supplier=Allied+Electronics; ComponentLink6Description: https://datasheet.ciiva.com/14592/70001050-14592330.pdf?src-supplier=Allied+Electronics; ComponentLink7URL: https://datasheet.ciiva.com/3004/taj-3004531.pdf?src-supplier=Avnet; ComponentLink7Description: https://datasheet.ciiva.com/3004/taj-3004531.pdf?src-supplier=Avnet; ComponentLink8URL: https://datasheet.ciiva.com/16201/taj-16201535.pdf?src-supplier=Future+Electronics; ComponentLink8Description: https://datasheet.ciiva.com/16201/taj-16201535.pdf?src-supplier=Future+Electronics; ComponentLink9URL: https://datasheet.ciiva.com/15163/getdatasheetpartid-121064-15163429.pdf?src-supplier=Verical; ComponentLink9Description: https://datasheet.ciiva.com/15163/getdatasheetpartid-121064-15163429.pdf?src-supplier=Verical; ComponentLink10URL: https://datasheet.ciiva.com/3004/taj-3004530.pdf?src-supplier=Avnet; ComponentLink10Description: https://datasheet.ciiva.com/3004/taj-3004530.pdf?src-supplier=Avnet
footprint Tantal 2917
pins: 1 P, 2 N

## TAJR104K020RNJ
designator C?  value 0.1uF
Cap Tant Solid 0.1uF 20V R CASE 10% (2.05 X 1.3 X 1.2mm) SMD 2012-12 25 Ohm 125AHA T/R; Part Number: TAJR104K020RNJ; Manufacturer: Kyocera AVX; Dielectric Material: Tantalum; ESR (Equivalent Series Resistance): 25R; Leakage Current: 500nA; Dissipation Factor: 4%; Life (Hours): 2000Hour; Ripple Current: 47mA; Supplier: Digikey; Supplier Part Number: 478-3286-1-ND; Manufacturer Part Number: TAJR104K020RNJ; RoHS: Yes; Category: Tantalum Capacitors; Stock: 9348; Pricing: 1=0.6, 10=0.369, 50=0.2792, 100=0.2515, 500=0.20466, 1000=0.19021 (USD); Mounting Technology: Surface Mount; Case/Package: 0805; Case Code (Metric): 2012; Case Code (Imperial): 0805; Weight: 0.000194oz; Min Operating Temperature: -55°C; Max Operating Temperature: 125°C; Tolerance: 10%; Package Quantity: 2500; Voltage Rating: 20V; Packaging: Cut Tape; Voltage Rating (DC): 20V; Termination: SMD/SMT; Features: General Purpose; Series: TAJ; Voltage Rating (AC): 20V; Length: 2.05mm; Width: 1.3mm; Height: 1.2mm; Lead Free: Lead Free; RoHS Compliant: Yes; ComponentLink1URL: https://datasheet.ciiva.com/11793/0900766b8070be5c-11793249.pdf?src-supplier=Rs; ComponentLink1Description: https://datasheet.ciiva.com/11793/0900766b8070be5c-11793249.pdf?src-supplier=Rs; ComponentLink2URL: https://datasheet.ciiva.com/263/tajlp-263875.pdf?src-supplier=Digikey; ComponentLink2Description: https://datasheet.ciiva.com/263/tajlp-263875.pdf?src-supplier=Digikey; ComponentLink3URL: https://datasheet.ciiva.com/263/tajlp-263876.pdf?src-supplier=Digikey; ComponentLink3Description: https://datasheet.ciiva.com/263/tajlp-263876.pdf?src-supplier=Digikey; ComponentLink4URL: https://datasheet.ciiva.com/263/tajlp-263877.pdf?src-supplier=Digikey; ComponentLink4Description: https://datasheet.ciiva.com/263/tajlp-263877.pdf?src-supplier=Digikey; ComponentLink5URL: https://datasheet.ciiva.com/7853/49917-7853165.pdf?src-supplier=Element14; ComponentLink5Description: https://datasheet.ciiva.com/7853/49917-7853165.pdf?src-supplier=Element14; ComponentLink6URL: https://datasheet.ciiva.com/7853/49917-7853166.pdf?src-supplier=Element14; ComponentLink6Description: https://datasheet.ciiva.com/7853/49917-7853166.pdf?src-supplier=Element14; ComponentLink7URL: https://datasheet.ciiva.com/16220/tajlp-16220328.pdf?src-supplier=Future+Electronics; ComponentLink7Description: https://datasheet.ciiva.com/16220/tajlp-16220328.pdf?src-supplier=Future+Electronics; ComponentLink8URL: https://datasheet.ciiva.com/14604/70001771-14604750.pdf?src-supplier=Allied+Electronics; ComponentLink8Description: https://datasheet.ciiva.com/14604/70001771-14604750.pdf?src-supplier=Allied+Electronics; ComponentLink9URL: https://datasheet.ciiva.com/14597/70001771-14597582.pdf?src-supplier=Allied+Electronics; ComponentLink9Description: https://datasheet.ciiva.com/14597/70001771-14597582.pdf?src-supplier=Allied+Electronics
footprint TAJR104K020RNJ
pins: 1 P, 2 N

## TCA39306DCUR
designator U?  (value not drawn)
FM+ I²C bus and SMBus voltage translator 8-VSSOP -40 to 125; Manufacturer: Texas Instruments; Manufacturer Part Number: TCA39306DCUR; Supplier: Digi-Key; Supplier Part Number: 296-TCA39306DCURCT-ND; RoHS: No; Category: Voltage Level Shifters; Stock: 21917; Pricing: 1=1.05000, 10=0.93800, 25=0.89040, 100=0.73140, 250=0.68368, 500=0.60420, 1000=0.47700 (USD); RoHS Compliant: Yes

## TCA39306DCURQ1
designator U?  (value not drawn)
Translation - Voltage Levels Automotive FM+ I C bus and SMBus voltage translator; Manufacturer: Texas Instruments; Manufacturer Part Number: TCA39306DCURQ1; Supplier: Mouser; Supplier Part Number: 595-TCA39306DCURQ1; RoHS: No; Category: Interface ICs; Stock: 8663; Pricing: 1=1.22000, 10=1.10000, 50=1.04000, 100=0.85400, 1000=0.55700, 10000=0.53800 (USD)
footprint TCA39306DCURQ1
pins: 1 GND, 2 VREF1, 3 SCL1, 4 SDA1, 5 SDA2, 6 SCL2, 7 VREF2, 8 EN

## TCJU157M035R0100E
designator C?  value 150uF  (hidden comment: *)
150UF/35V 100MOHM, U-case; Manufacturer: Kyocera AVX; Manufacturer Part Number: TCJU157M035R0100E; Supplier: Digi-Key; Supplier Part Number: 478-TCJU157M035R0100ECT-ND; Stock: 166; Pricing: 1=4.60000, 10=4.13600, 50=3.58440, 100=3.12490 (USD); RoHS: No; Case/Package: 2924 (7361 Metric)
footprint Tantal  2924 (Molded Capacitor, 2-Leads, Body 7.30x6.10mm, IPC Medium Density)
pins: 1 P, 2 N

## TCK106AF,LF
designator U?  (value not drawn)
Power Switch 1-OUT 1A 0.175Ohm 5-Pin SMV T/R; Manufacturer: Toshiba; Manufacturer Part Number: TCK106AF,LF; Supplier 1: Digi-Key; RoHS: No; Category: Power Management ICs; Stock 1: 10545; Pricing 1: 1=0.49000, 10=0.39900, 25=0.36480, 100=0.27140, 250=0.24592, 500=0.20352, 1000=0.15264 (USD); ComponentLink1URL: https://toshiba.semicon-storage.com/info/docget.jsp?did=53240&prodName=TCK108AF&src-supplier=Digi-Key; ComponentLink1Description: https://toshiba.semicon-storage.com/info/docget.jsp?did=53240&prodName=TCK108AF&src-supplier=Digi-Key; Supplier Part Number 1: TCK106AFLFCT-ND
footprint SC-74A, SOT-753
pins: 1 VOUT, 2 GND, 3 CON, 4 NC, 5 VIN
